# Altium footprint library KwantLib.PcbLib: 249 footprints (part 12 of 16)
Each footprint in its own frame and in the unit in brackets; x right, y up, seen from the top. Pads: shape width x height; smd on the part's side, far side on the other; paste and mask are expansions set on the pad; w line width, h text height; cw(c..) or ccw(c..) is an arc to the next point about the centre after c.
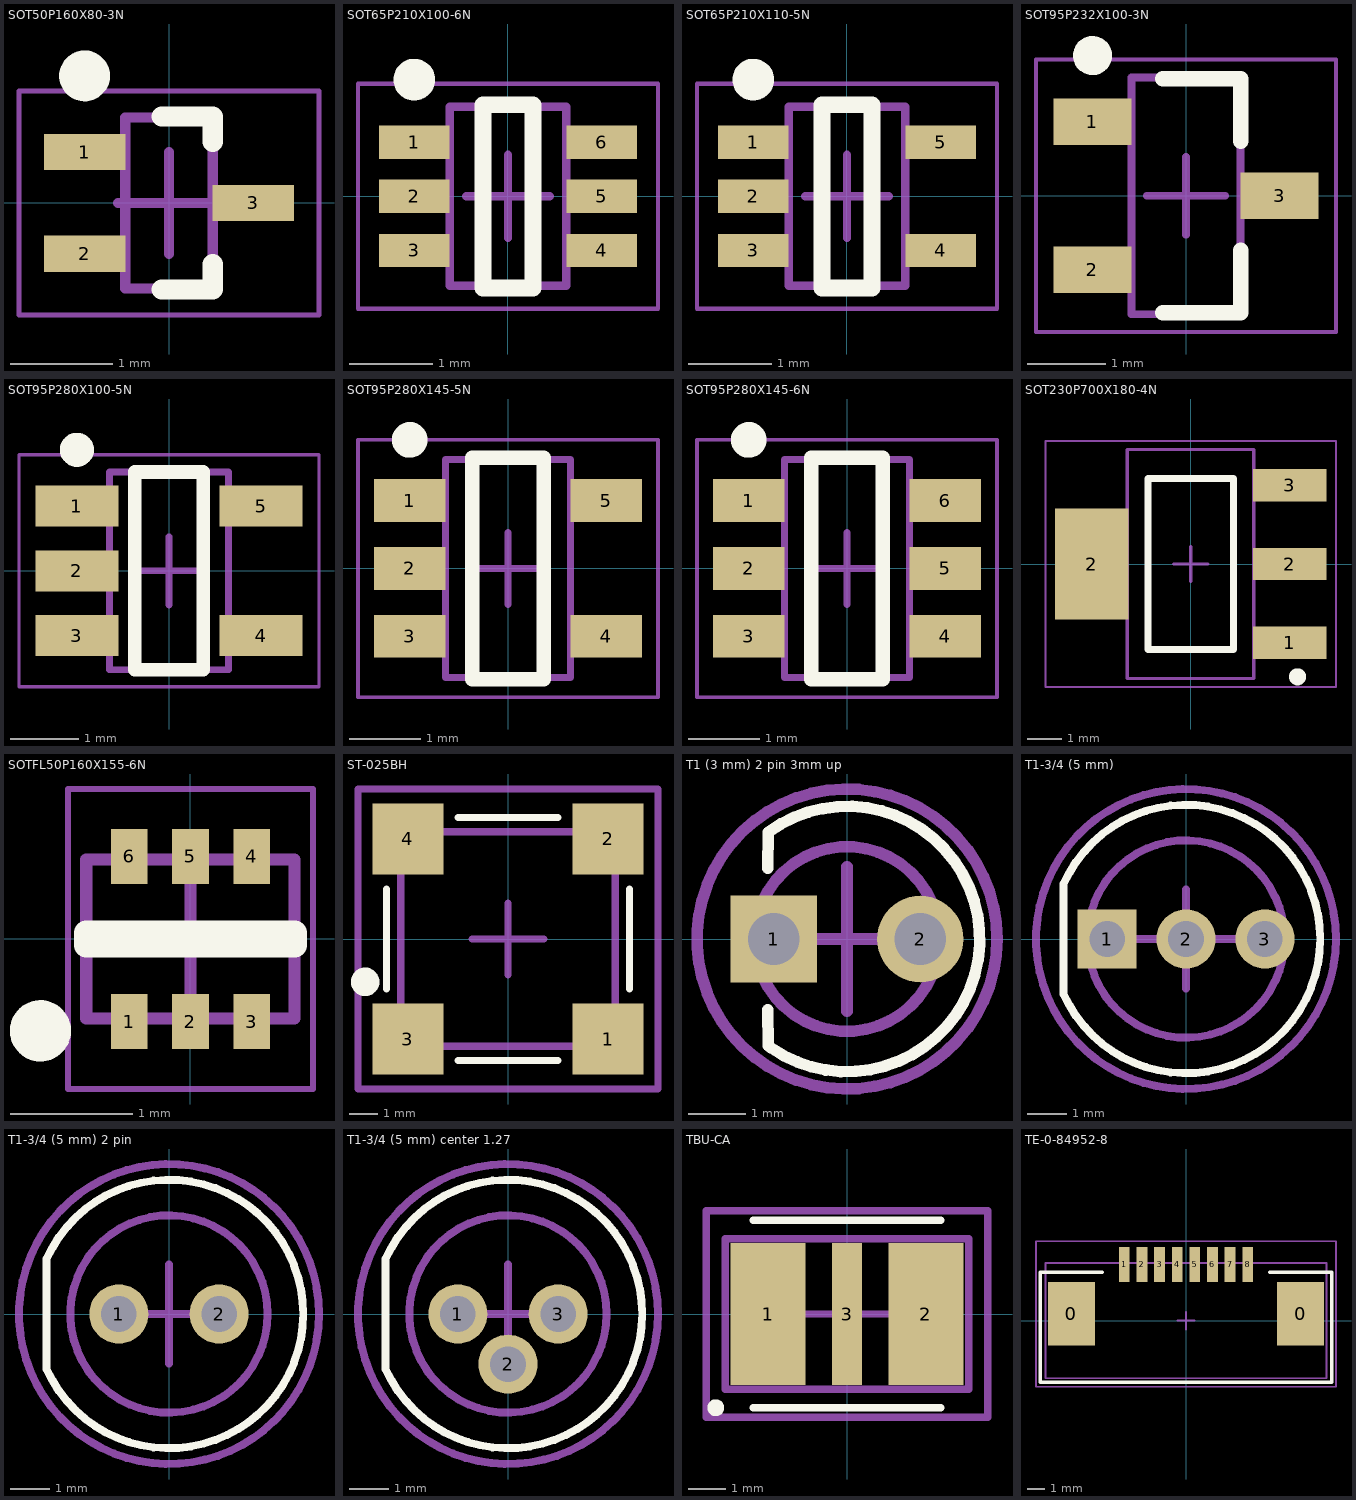
[diagram p11: the footprints below, top view; thin cyan lines are the x and y axes]

## SOT50P160X80-3N [mm] "SC-75A, 3-Leads, Body 1,58x1,60mm, Pitch 0,50mm, IPC Medium Density"
height 0.8
pads (3):
  rect 0.8x0.356 smd: 1(-0.83,0.5) 2(-0.83,-0.5) 3(0.83,0)
Top Overlay:
  circle w0.25: c-0.83,1.25 r0.125
  lines w0.2: -0.07,-0.85 0.43,-0.85 0.43,-0.6 ; -0.07,0.85 0.43,0.85 0.43,0.6
Mechanical 13:
  lines w0.1: -0.43,-0.84 0.43,-0.84 0.43,0.84 -0.43,0.84 -0.43,-0.84
Mechanical 15:
  lines w0.05: -1.475,-1.1 1.475,-1.1 1.475,1.1 -1.475,1.1 -1.475,-1.1
  lines w0.1: -0.5,0 0.5,0 ; 0,-0.5 0,0.5
3D body "SOT50P160X80-3N.step": height 0.8, standoff 0, extent -0.9,-0.84 0.9,0.84

## SOT65P210X100-6N [mm] "SC70-6, SOT323, 6-Leads, Body 2.00x2.10mm, Pitch 0.65mm, IPC Medium Density"
height 1
pads (6):
  rect 0.85x0.4 smd paste-0.03 mask+0.07: 1(-1.125,0.65) 2(-1.125,0) 3(-1.125,-0.65) 4(1.125,-0.65) 5(1.125,0) 6(1.125,0.65)
Top Overlay:
  circle w0.25: c-1.125,1.4 r0.125
  lines w0.2: -0.3,-1.1 -0.3,1.1 0.3,1.1 0.3,-1.1 -0.3,-1.1
Mechanical 13:
  lines w0.1: -0.7,-1.075 0.7,-1.075 0.7,1.075 -0.7,1.075 -0.7,-1.075
Mechanical 15:
  lines w0.05: -1.8,-1.35 1.8,-1.35 1.8,1.35 -1.8,1.35 -1.8,-1.35
  lines w0.1: -0.5,0 0.5,0 ; 0,-0.5 0,0.5
3D body "SOT65P210X100-6N_2.step": height 1, standoff 0, extent -1.05,-1 1.05,1

## SOT65P210X110-5N [mm] "SC70-5, SOT23, 5-Leads, Body 2.00x2.10mm, Pitch 0.65mm, IPC Medium Density"
height 1.1
pads (5):
  rect 0.85x0.4 smd paste-0.03 mask+0.07: 1(-1.125,0.65) 2(-1.125,0) 3(-1.125,-0.65) 4(1.125,-0.65) 5(1.125,0.65)
Top Overlay:
  circle w0.25: c-1.125,1.4 r0.125
  lines w0.2: -0.3,-1.1 -0.3,1.1 0.3,1.1 0.3,-1.1 -0.3,-1.1
Mechanical 13:
  lines w0.1: -0.7,-1.075 0.7,-1.075 0.7,1.075 -0.7,1.075 -0.7,-1.075
Mechanical 15:
  lines w0.05: -1.8,-1.35 1.8,-1.35 1.8,1.35 -1.8,1.35 -1.8,-1.35
  lines w0.1: -0.5,0 0.5,0 ; 0,-0.5 0,0.5
3D body "SOT65P210X110-5N.step": height 1.1, standoff 0, extent -1.2,-1.075 1.2,1.075

## SOT95P232X100-3N [mm] "SOT23, 3-Leads, Body 2.92x2.32mm, Pitch 0.95mm, IPC Medium Density"
height 1
pads (3):
  rect 1x0.6 smd paste-0.03: 1(-1.2,0.95) 2(-1.2,-0.95) 3(1.2,0)
Top Overlay:
  circle w0.25: c-1.2,1.8 r0.125
  lines w0.2: -0.3,-1.5 0.7,-1.5 0.7,-0.7 ; -0.3,1.5 0.7,1.5 0.7,0.7
Mechanical 13:
  lines w0.1: -0.7,-1.52 -0.7,1.52 0.7,1.52 0.7,-1.52 -0.7,-1.52
Mechanical 15:
  lines w0.05: -1.925,-1.75 -1.925,1.75 1.925,1.75 1.925,-1.75 -1.925,-1.75
  lines w0.1: -0.5,0 0.5,0 ; 0,-0.5 0,0.5
3D body "SOT95P232X100-3N.step": height 1, standoff 0, extent -1.32,-1.52 1.32,1.52

## SOT95P280X100-5N [mm] "SOT23, 5-Leads, Body 2.90x2.80mm, Pitch 0.95mm, IPC Medium Density"
height 1
pads (5):
  rect 1.22x0.6 smd paste-0.05 mask+0.07: 1(-1.35,0.95) 2(-1.35,0) 3(-1.35,-0.95) 4(1.35,-0.95) 5(1.35,0.95)
Top Overlay:
  circle w0.25: c-1.35,1.775 r0.125
  lines w0.2: -0.5,-1.45 -0.5,1.45 0.5,1.45 0.5,-1.45 -0.5,-1.45
Mechanical 13:
  lines w0.1: -0.875,-1.45 0.875,-1.45 0.875,1.45 -0.875,1.45 -0.875,-1.45
Mechanical 15:
  lines w0.05: -2.2,-1.7 2.2,-1.7 2.2,1.7 -2.2,1.7 -2.2,-1.7
  lines w0.1: -0.5,0 0.5,0 ; 0,-0.5 0,0.5
3D body "SOT95P280X100-5N.step": height 1, standoff 0, extent -1.4,-1.45 1.4,1.45

## SOT95P280X145-5N [mm] "SOT23, 5-Leads, Body 2.90x2.80mm, Pitch 0.95mm, IPC Medium Density"
height 1.45
pads (5):
  rect 1x0.6 smd paste-0.05 mask+0.07: 1(-1.375,0.95) 2(-1.375,0) 3(-1.375,-0.95) 4(1.375,-0.95) 5(1.375,0.95)
Top Overlay:
  circle w0.25: c-1.375,1.8 r0.125
  lines w0.2: -0.5,-1.55 -0.5,1.55 0.5,1.55 0.5,-1.55 -0.5,-1.55
Mechanical 13:
  lines w0.1: -0.875,-1.525 0.875,-1.525 0.875,1.525 -0.875,1.525 -0.875,-1.525
Mechanical 15:
  lines w0.05: -2.1,-1.8 2.1,-1.8 2.1,1.8 -2.1,1.8 -2.1,-1.8
  lines w0.1: -0.5,0 0.5,0 ; 0,-0.5 0,0.5
3D body "SOT95P280X145-5N.step": height 1.45, standoff 0, extent -1.5,-1.525 1.5,1.525

## SOT95P280X145-6N [mm] "SOT23, 6-Leads, Body 2.92x2.80mm, Pitch 0.95mm, IPC Medium Density"
height 1.45
pads (6):
  rect 1x0.6 smd: 1(-1.375,0.95) 2(-1.375,0) 3(-1.375,-0.95) 4(1.375,-0.95) 5(1.375,0) 6(1.375,0.95)
Top Overlay:
  circle w0.25: c-1.375,1.8 r0.125
  lines w0.2: -0.5,-1.55 0.5,-1.55 0.5,1.55 -0.5,1.55 -0.5,-1.55
Mechanical 13:
  lines w0.1: -0.875,-1.525 -0.875,1.525 0.875,1.525 0.875,-1.525 -0.875,-1.525
Mechanical 15:
  lines w0.05: -2.1,-1.8 -2.1,1.8 2.1,1.8 2.1,-1.8 -2.1,-1.8
  lines w0.1: -0.5,0 0.5,0 ; 0,-0.5 0,0.5
3D body "SOT95P280X145-6N_.step": height 1.45, standoff 0, extent -1.6,-1.525 1.6,1.525

## SOT230P700X180-4N [mm] "SOT223, 4-Leads, Body 6.50x7.00mm (avg), Pitch 2.30mm, IPC Medium Density"
height 1.8
pads (4):
  rect 2.15x0.95 smd: 1(2.9,-2.3) 2(2.9,0) 3(2.9,2.3)
  rect 2.15x3.25 smd: 2(-2.9,0)
Top Overlay:
  circle w0.25: c3.125,-3.3 r0.125
  lines w0.2: -1.25,-2.5 -1.25,2.5 1.25,2.5 1.25,-2.5 -1.25,-2.5
Mechanical 13:
  lines w0.1: -1.85,-3.35 -1.85,3.35 1.85,3.35 1.85,-3.35 -1.85,-3.35
Mechanical 15:
  lines w0.05: -4.25,-3.6 -4.25,3.6 4.25,3.6 4.25,-3.6 -4.25,-3.6
  lines w0.1: -0.5,0 0.5,0 ; 0,-0.5 0,0.5
3D body "SOT230P700X180-4N.step": height 1.8, standoff 0, extent -3.5,-3.35 3.5,3.35

## SOTFL50P160X155-6N [mm] "SOTFL, 6-Leads, Body 1.60x1.60mm, Pitch 0.50mm, IPC Medium Density"
height 1.55
pads (6):
  rect 0.3x0.45 smd mask+0.07: 1(-0.5,-0.675) 2(0,-0.675) 3(0.5,-0.675) 4(0.5,0.675) 5(0,0.675) 6(-0.5,0.675)
Top Overlay:
  circle w0.25: c-1.225,-0.75 r0.125
  lines w0.2: -0.85,-0.05 0.85,-0.05 0.85,0.05 -0.85,0.05 -0.85,-0.05
Mechanical 13:
  lines w0.1: -0.85,-0.65 -0.85,0.65 0.85,0.65 0.85,-0.65 -0.85,-0.65
Mechanical 15:
  lines w0.05: -1,-1.225 -1,1.225 1,1.225 1,-1.225 -1,-1.225
  lines w0.1: -0.5,0 0.5,0 ; 0,-0.5 0,0.5
3D body "xxx.step": height 0.55, standoff 0, extent -0.848,-0.8 0.848,0.8

## ST-025BH [mm] "Sobertonic Magnetic Buzzer"
height 2.5
pads (4):
  rect 2.5x2.5 smd mask+0.07: 1(3.5,-3.5) 2(3.5,3.5) 3(-3.5,-3.5) 4(-3.5,3.5)
Top Overlay:
  circle w0.6: c-5,-1.5 r0.2
  lines w0.254: -4.25,-1.75 -4.25,1.75 ; -1.75,-4.25 1.75,-4.25 ; -1.75,4.25 1.75,4.25 ; 4.25,-1.75 4.25,1.75
Mechanical 13:
  lines w0.254: -3.75,-3.75 3.75,-3.75 3.75,3.75 -3.75,3.75 -3.75,-3.75
Mechanical 15:
  lines w0.254: -1.25,0 1.25,0 ; 0,-1.25 0,1.25 ; -5.25,-5.25 5.25,-5.25 5.25,5.25 -5.25,5.25 -5.25,-5.25
3D body "ST-025BL-norm.stp": height 2.52, standoff 0, extent -3.75,-3.75 3.75,3.75

## T1 (3 mm) 2 pin 3mm up [mm] "LED Throuh hole, 3mm dia"
pads (2):
  rect 1.5x1.5 hole 0.9 mask+0.07: 1(-1.27,0)
  round 1.5 hole 0.9 mask+0.07: 2(1.27,0)
Top Overlay:
  lines w0.2: -1.375,-1.225 -1.364,-1.852 ; -1.375,1.225 -1.364,1.852 cw(c0,0) -1.319,-1.884
Mechanical 13:
  circle w0.2: c0,0 r1.6
Mechanical 15:
  circle w0.2: c0,0 r2.6
  lines w0.2: -1.25,0 1.25,0 ; 0,-1.25 0,1.25
3D body "LED T-1 3mm подъем.stp": height 7.4, standoff -2, extent -1.6,-1.597 1.6,1.597

## T1-3/4 (5 mm) [mm] "LED Throuh hole, 5mm dia"
pads (3):
  rect 1.5x1.5 hole 0.9 mask+0.07: 1(-2,0)
  round 1.5 hole 0.9 mask+0.07: 2(0,0) 3(2,0)
Top Overlay:
  lines w0.2: -3.099,-1.399 ccw(c0,0) -3.099,1.399 -3.099,-1.399
Mechanical 13:
  circle w0.2: c0,0 r2.5
Mechanical 15:
  circle w0.2: c0,0 r3.8
  lines w0.2: -1.25,0 1.25,0 ; 0,-1.25 0,1.25
3D body "HLMP-4000_.stp": height 14.19, standoff -1.5, extent -2.54,-3.049 3.05,3.05

## T1-3/4 (5 mm) 2 pin [mm] "LED Throuh hole, 5mm dia"
pads (2):
  round 1.5 hole 0.9 mask+0.07: 1(-1.27,0) 2(1.27,0)
Top Overlay:
  lines w0.2: -3.099,-1.399 ccw(c0,0) -3.099,1.399 -3.099,-1.399
Mechanical 13:
  circle w0.2: c0,0 r2.5
Mechanical 15:
  circle w0.2: c0,0 r3.8
  lines w0.2: -1.25,0 1.25,0 ; 0,-1.25 0,1.25
3D body "TSAL6200.stp": height 13.19, standoff -1.5, extent -2.54,-3.049 3.05,3.05

## T1-3/4 (5 mm) center 1.27 [mm] "LED Throuh hole, 5mm dia"
pads (3):
  round 1.5 hole 0.9 mask+0.07: 1(-1.27,0) 2(0,-1.27) 3(1.27,0)
Top Overlay:
  lines w0.2: -3.099,-1.399 ccw(c0,0) -3.099,1.399 -3.099,-1.399
Mechanical 13:
  circle w0.2: c0,0 r2.5
Mechanical 15:
  circle w0.2: c0,0 r3.8
  lines w0.2: -1.25,0 1.25,0 ; 0,-1.25 0,1.25
3D body "BPV11F_.stp": height 13.19, standoff -1.5, extent -2.54,-3.049 3.05,3.05

## TBU-CA [mm]
height 1
pads (3):
  rect 2x3.8 smd paste-0.06 mask+0.07: 1(-2.1,0) 2(2.1,0)
  rect 0.8x3.8 smd paste-0.06 mask+0.07: 3(0,0)
Top Overlay:
  circle w0.25: c-3.5,-2.5 r0.1
  lines w0.2: -2.5,-2.5 2.5,-2.5 ; -2.5,2.5 2.5,2.5
Mechanical 13:
  lines w0.2: -3.25,-2 -3.25,2 3.25,2 3.25,-2 -3.25,-2
Mechanical 15:
  lines w0.2: -1.25,0 1.25,0 ; 0,-1.25 0,1.25 ; -3.75,-2.75 -3.75,2.75 3.75,2.75 3.75,-2.75 -3.75,-2.75
3D body "TBU-CA065.stp": height 1, standoff 0, extent -3.25,-2 3.25,2

## TE-0-84952-8 [mm] "FPC Connector, 1.0mm pitch, Bottom contact, 8 pins"
height 2.56
pads (10):
  rect 2.68x3.6 smd mask+0.07: 0(-6.49,0.38) 0(6.49,0.38)
  rect 0.61x2 smd mask+0.07: 1(-3.5,3.18) 2(-2.5,3.18) 3(-1.5,3.18) 4(-0.5,3.18) 5(0.5,3.18) 6(1.5,3.18) 7(2.5,3.18) 8(3.5,3.18)
Top Overlay:
  lines w0.2: -4.75,2.75 -8.25,2.75 -8.25,-3.5 8.25,-3.5 8.25,2.75 4.75,2.75
Mechanical 13:
  lines w0.1: -7.965,-3.27 7.965,-3.27 7.965,3.27 -7.965,3.27 -7.965,-3.27
Mechanical 15:
  lines w0.1: -0.5,0 0.5,0 ; 0,-0.5 0,0.5 ; -8.5,-3.75 8.5,-3.75 8.5,4.5 -8.5,4.5 -8.5,-3.75
3D body "84952-8-norm.stp": height 2.56, standoff 0, extent -7.965,-3.27 7.965,3.27